# Altium footprint library lib_protel_HC.PCBLIB: 724 footprints (part 38 of 46)
Each footprint in its own frame and in the unit in brackets; x right, y up, seen from the top. Pads: shape width x height; smd on the part's side, far side on the other; paste and mask are expansions set on the pad; w line width, h text height; cw(c..) or ccw(c..) is an arc to the next point about the centre after c.
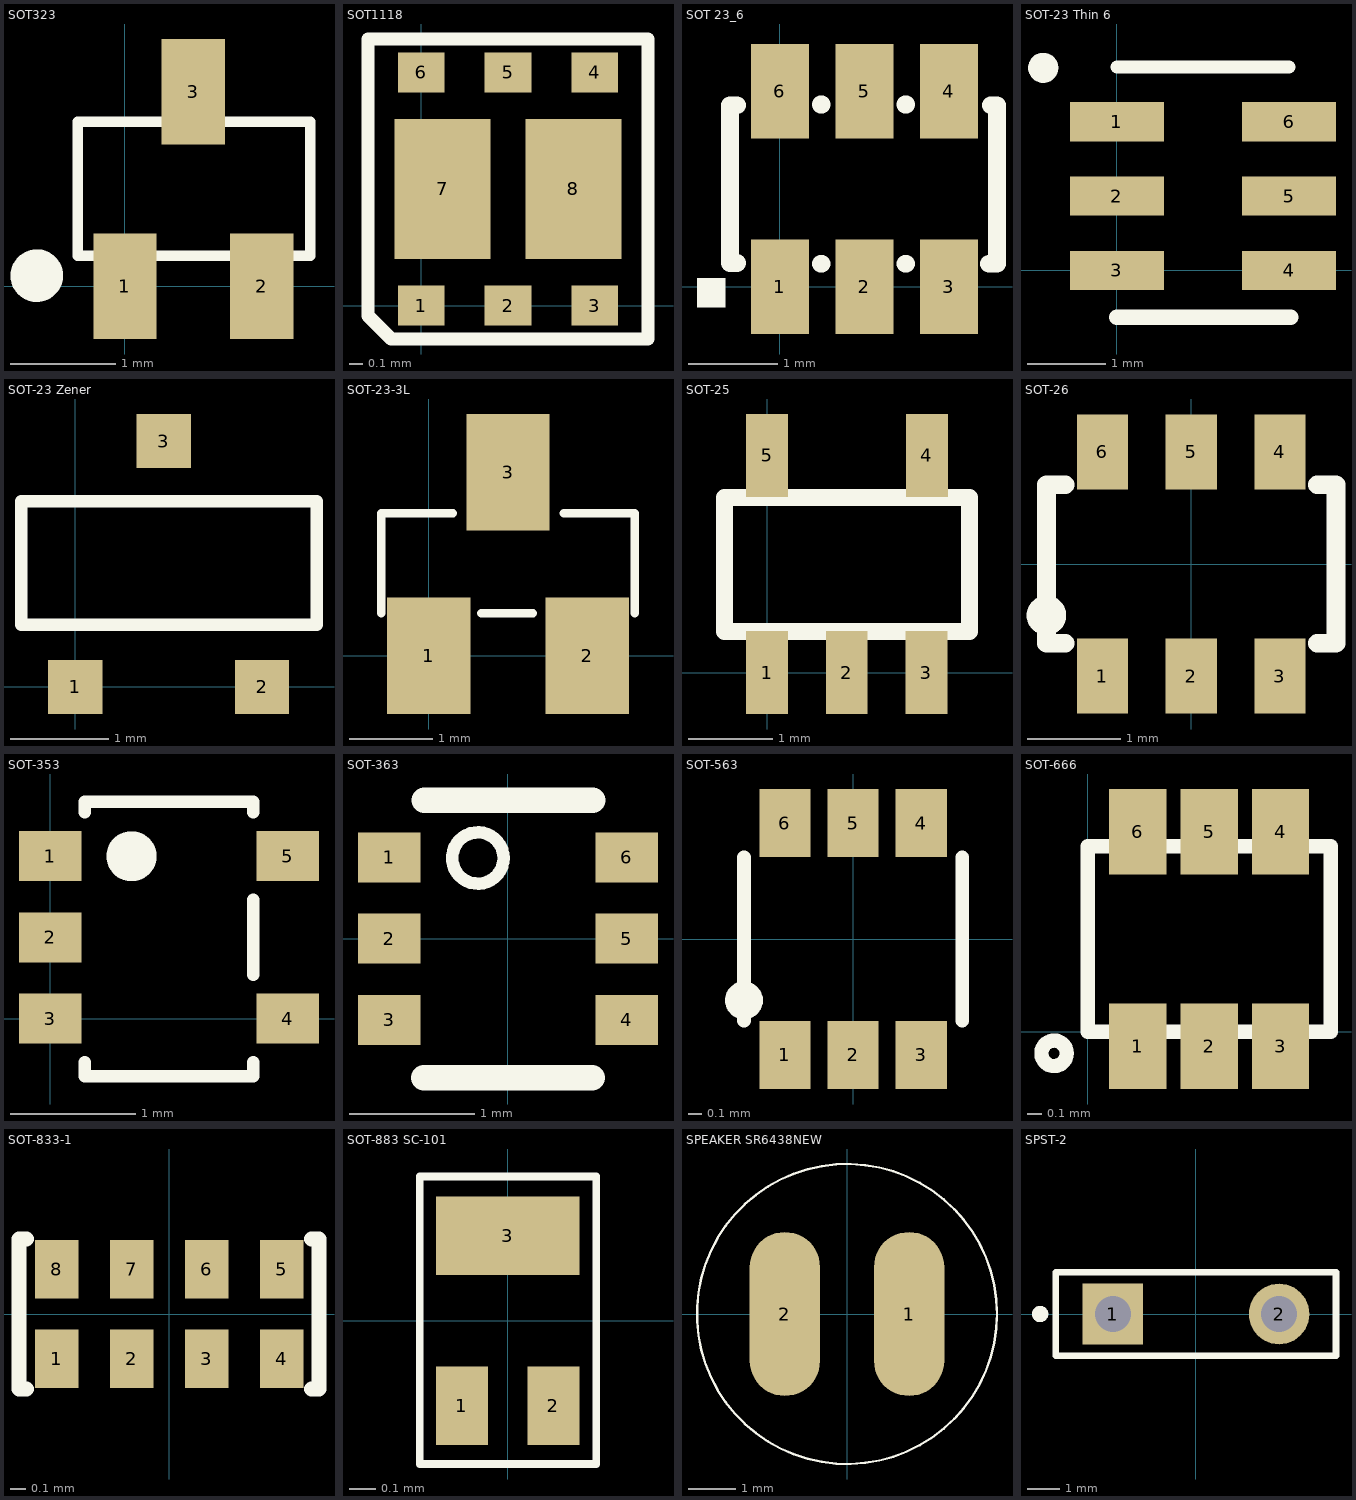
[diagram p37: the footprints below, top view; thin cyan lines are the x and y axes]

## SOT323 [mm] "SOT 323 (SC-70)"
height 1.1
pads (3):
  rect 0.6x1 smd: 1(0,0) 2(1.3,0) 3(0.65,1.85)
Top Overlay:
  circle w0.25: c-0.836,0.102 r0.125
  lines w0.1: -0.447,0.292 -0.447,1.562 1.763,1.562 1.763,0.292 -0.447,0.292

## SOT1118 [mm] "TRANSISTOR DOBLE NPN"
height 0.65
pads (8):
  rect 0.35x0.3 smd mask+0.05: 1(0,0) 2(0.65,0) 3(1.3,0) 4(1.3,1.75) 5(0.65,1.75) 6(0,1.75)
  rect 0.72x1.05 smd mask+0.05: 7(0.16,0.875) 8(1.14,0.875)
Top Overlay:
  lines w0.1: -0.4,-0.075 -0.4,2 1.7,2 1.7,-0.25 -0.225,-0.25 -0.4,-0.075
3D body "User Library-PMPB95ENEA.STEP": height 0.65, standoff 0, extent -0.35,-0.125 1.65,1.875

## SOT 23_6 [mm]
height 1.45
pads (6):
  rect 0.65x1.06 smd: 1(0,0) 2(0.95,0) 3(1.9,0) 4(1.9,2.2) 5(0.95,2.2) 6(0,2.2)
Top Overlay:
  rectangle: -0.931,-0.231 -0.61,0.1
  lines w0.2: -0.56,0.27 -0.48,0.27 ; -0.56,2.04 -0.48,2.04 ; 0.46,0.26 0.47,0.26 ; 0.46,2.05 0.47,2.05 ; 1.41,0.26 1.42,0.26 ; 1.41,2.05 1.42,2.05 ; 2.35,0.26 2.44,0.26 ; 2.37,2.04 2.44,2.04
  lines w0.203: -0.56,0.273 -0.56,2.023 ; 2.44,0.273 2.44,2.023
3D body "User Library-SOT23-6-2.step": height 1.45, standoff 0, extent -0.5,-0.3 2.4,2.5

## SOT-23 Thin 6 [mm] "SOT-23 Thin MAXIM Z6-1"
height 1
pads (6):
  rect 1.2x0.5 smd: 1(0,1.9) 2(0,0.95) 3(0,0) 4(2.2,0) 5(2.2,0.95) 6(2.2,1.9)
Top Overlay:
  circle w0.2: c-0.942,2.59 r0.092
  lines w0.17: 0,2.6 2.2,2.6
  lines w0.2: 0,-0.6 2.22,-0.6

## SOT-23 Zener [mm] "Dual Zener Common Anode"
height 1.12
pads (3):
  rect 0.55x0.55 smd: 1(0,0) 2(1.9,0) 3(0.9,2.5)
Top Overlay:
  lines w0.127: -0.547,0.63 2.453,0.63 2.453,1.89 -0.547,1.89 -0.547,0.63

## SOT-23-3L [mm] "MMBT2222A"
height 1.2
pads (3):
  rect 1x1.4 smd: 1(0,0) 2(1.9,0) 3(0.95,2.2)
Top Overlay:
  lines w0.1: -0.57,0.51 -0.57,1.71 0.29,1.71 ; 0.63,0.51 1.25,0.51 ; 1.62,1.71 2.47,1.71 2.47,0.51
3D body "User Library-SOT23-3.step": height 1.3, standoff 0, extent -0.5,-0.3 2.4,2.5

## SOT-25 [mm]
height 1.3
pads (5):
  rect 0.5x0.99 smd: 1(0,0) 2(0.95,0) 3(1.9,0) 4(1.906,2.59) 5(0,2.59)
Top Overlay:
  lines w0.203: -0.507,0.488 -0.507,2.088 2.413,2.088 2.413,0.488 -0.507,0.488
3D body "SW3dPS-SOT-23-5L.STEP": height 1.67, standoff 0.56, extent -0.475,-0.125 2.425,2.675

## SOT-26 [mm]
height 1.3
pads (6):
  rect 0.55x0.8 smd: 1(-0.95,-1.2) 2(0,-1.2) 3(0.95,-1.2) 4(0.95,1.2) 5(0,1.2) 6(-0.95,1.2)
Top Overlay:
  circle w0.2: c-1.55,-0.55 r0.112
  lines w0.2: -1.35,-0.85 -1.55,-0.85 -1.55,0.85 -1.35,0.85 ; 1.35,-0.85 1.55,-0.85 1.55,0.85 1.35,0.85
3D body "SW3dPS-SOT-23-5L.STEP": height 1.67, standoff 0.56, extent -1.425,-1.325 1.475,1.475

## SOT-353 [mm]
height 1.1
pads (5):
  rect 0.5x0.4 smd: 1(0,1.3) 2(0,0.65) 3(0,0) 4(1.9,0) 5(1.9,1.3)
Top Overlay:
  circle w0.2: c0.65,1.3 r0.1
  lines w0.1: 0.275,-0.35 0.275,-0.462 1.563,-0.462 1.625,-0.462 1.625,-0.35 ; 0.275,1.65 0.275,1.738 1.625,1.738 1.625,1.65 ; 1.625,0.35 1.625,0.95

## SOT-363 [mm]
height 1.1
pads (6):
  rect 0.5x0.4 smd: 1(-0.95,0.65) 2(-0.95,0) 3(-0.95,-0.65) 4(0.95,-0.65) 5(0.95,0) 6(0.95,0.65)
Top Overlay:
  circle w0.1: c-0.241,0.645 r0.205
  lines w0.203: -0.675,-1.112 0.675,-1.112 ; -0.671,1.107 0.679,1.107
3D body "User Library-sot363.step": height 1, standoff 0, extent -1.15,-1.05 1.15,1.05

## SOT-563 [mm]
pads (6):
  rect 0.375x0.5 smd: 1(-0.5,-0.85) 3(0.5,-0.85) 4(0.5,0.85) 5(0,0.85) 6(-0.5,0.85)
  rect 0.375x0.5 smd mask+0.102: 2(0,-0.85)
Top Overlay:
  circle w0.1: c-0.8,-0.45 r0.089
  lines w0.1: -0.8,-0.6 -0.8,0.6 ; 0.8,-0.6 0.8,0.6

## SOT-666 [mm]
height 0.6
pads (6):
  rect 0.4x0.6 smd: 1(0.35,-0.1) 3(1.35,-0.1) 4(1.35,1.4) 5(0.85,1.4) 6(0.35,1.4)
  rect 0.4x0.6 smd mask+0.102: 2(0.85,-0.1)
Top Overlay:
  circle w0.1: c-0.236,-0.15 r0.089
  lines w0.1: 0,0 1.7,0 1.7,1.3 0,1.3 0,0

## SOT-833-1 [mm]
pads (8):
  rect 0.29x0.39 smd: 1(-0.75,-0.3) 2(-0.25,-0.3) 3(0.25,-0.3) 4(0.75,-0.3) 5(0.75,0.3) 6(0.25,0.3) 7(-0.25,0.3) 8(-0.75,0.3)
Top Overlay:
  lines w0.1: -0.95,-0.5 -1,-0.5 -1,0.5 -0.95,0.5 ; 0.95,-0.5 1,-0.5 1,0.5 0.95,0.5

## SOT-883 SC-101 [mm] "BC847"
height 0.5
pads (3):
  rect 0.2x0.3 smd mask+0.03: 1(-0.175,-0.325) 2(0.175,-0.325)
  rect 0.55x0.3 smd mask+0.03: 3(0,0.325)
Top Overlay:
  lines w0.03: -0.336,-0.548 -0.336,0.552 0.339,0.552 0.339,-0.548 -0.336,-0.548
3D body: height 0.5, standoff 0, extent -0.336,-0.548 0.339,0.552

## SPEAKER SR6438NEW [mm] "ALTAVOZ MINIATURA"
height 4.14
pads (2):
  oval 1.5x3.5 smd mask+0.05: 1(1.325,0) 2(-1.325,0)
Top Overlay:
  circle w0.05: c0,0 r3.2

## SPST-2 [mm]
pads (2):
  rect 1.85x1.85 on Top hole 1.1: 1(-2.54,0)
  round 1.85 on Top hole 1.1: 2(2.54,0)
Top Overlay:
  circle w0.25: c-4.761,-0.001 r0.125
  lines w0.2: -4.28,-1.27 -4.28,1.27 4.28,1.27 4.28,-1.27 -4.28,-1.27